# Altium footprint library con-samtec.PCBLIB: 805 footprints (part 23 of 55)
Each footprint in its own frame and in the unit in brackets; x right, y up, seen from the top. Pads: shape width x height; smd on the part's side, far side on the other; paste and mask are expansions set on the pad; w line width, h text height; cw(c..) or ccw(c..) is an arc to the next point about the centre after c.
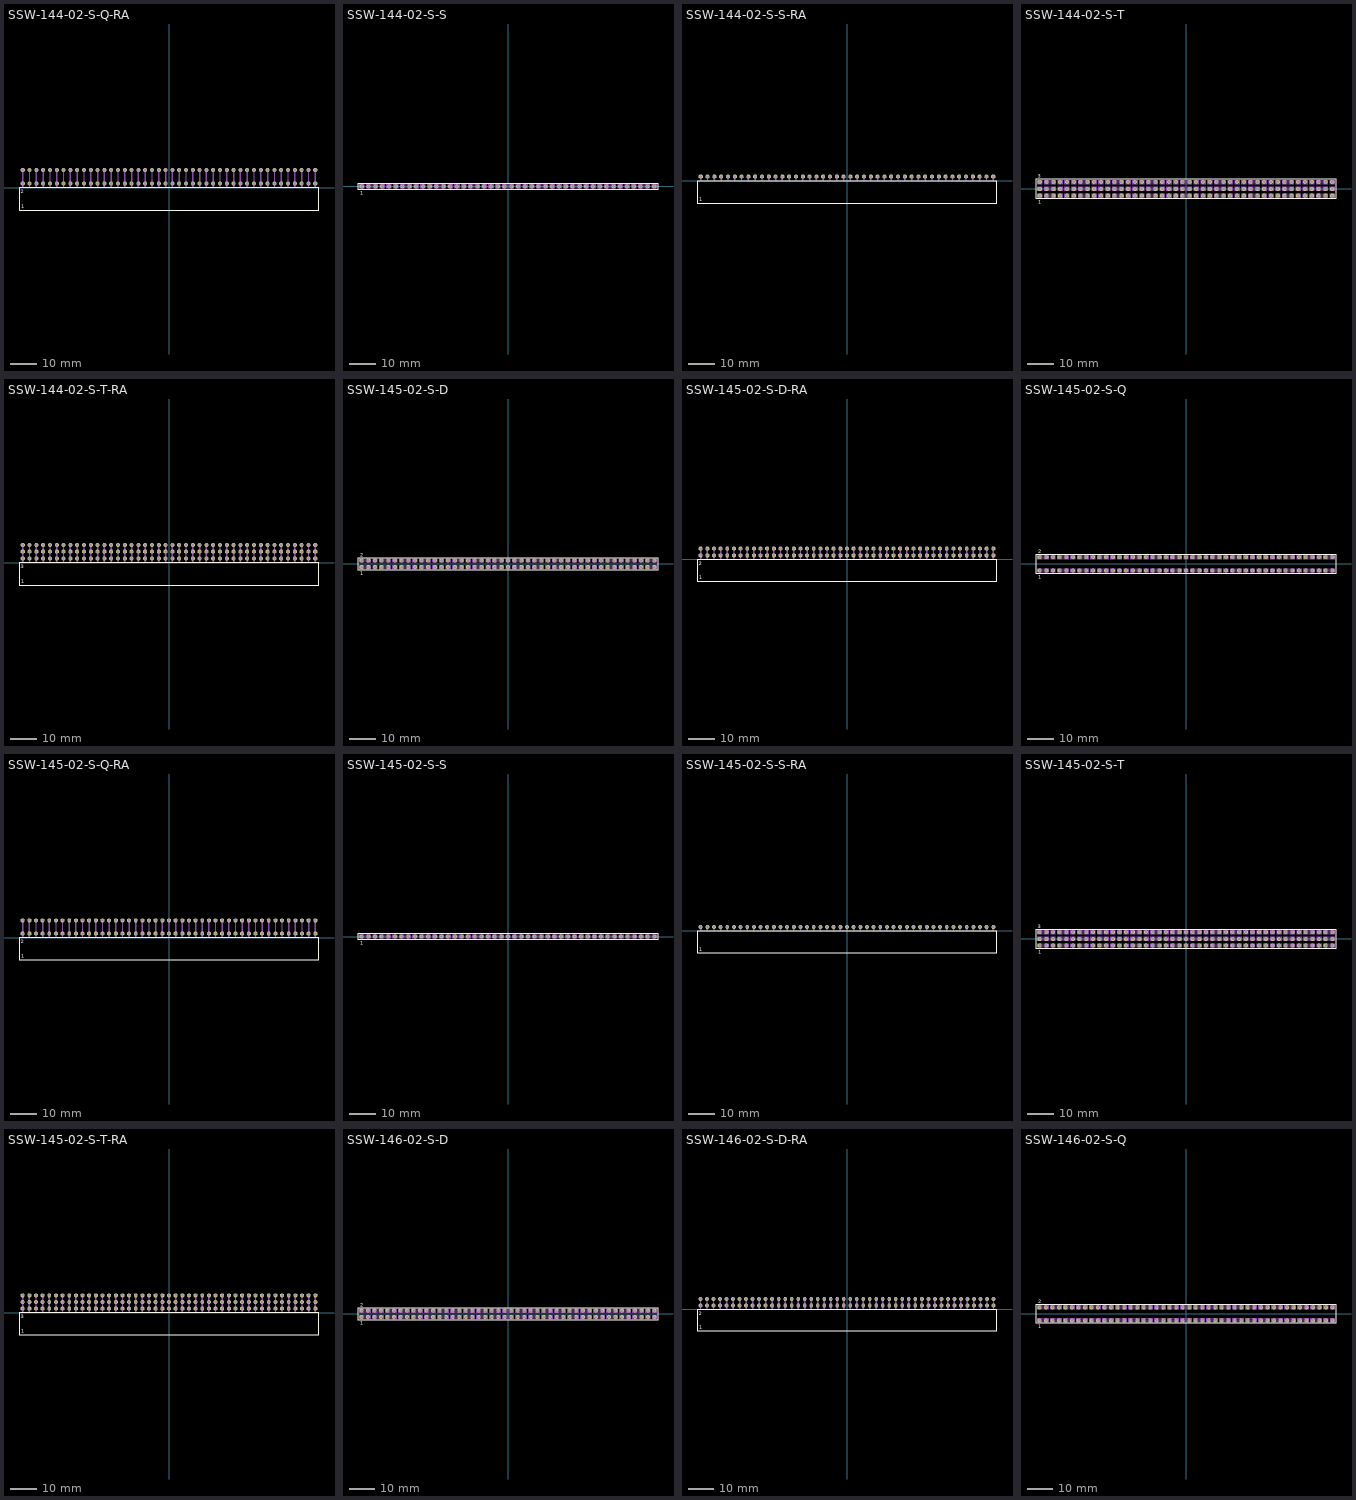
[diagram p22: the footprints below, top view; thin cyan lines are the x and y axes]

## SSW-144-02-S-Q-RA [mil]
pads (88):
  oct 59.06x59.06 hole 39.37: 1(-2150,60) 2(-2150,260) 3(-2050,60) 4(-2050,260) 5(-1950,60) 6(-1950,260) 7(-1850,60) 8(-1850,260) 9(-1750,60) 10(-1750,260) 11(-1650,60) 12(-1650,260) 13(-1550,60) 14(-1550,260) 15(-1450,60) 16(-1450,260) 17(-1350,60) 18(-1350,260) 19(-1250,60) 20(-1250,260) 21(-1150,60) 22(-1150,260) 23(-1050,60) 24(-1050,260) 25(-950,60) 26(-950,260) 27(-850,60) 28(-850,260) 29(-750,60) 30(-750,260) 31(-650,60) 32(-650,260) 33(-550,60) 34(-550,260) 35(-450,60) 36(-450,260) 37(-350,60) 38(-350,260) 39(-250,60) 40(-250,260) 41(-150,60) 42(-150,260) 43(-50,60) 44(-50,260) 45(50,60) 46(50,260) 47(150,60) 48(150,260) 49(250,60) 50(250,260) 51(350,60) 52(350,260) 53(450,60) 54(450,260) 55(550,60) 56(550,260) 57(650,60) 58(650,260) 59(750,60) 60(750,260) 61(850,60) 62(850,260) 63(950,60) 64(950,260) 65(1050,60) 66(1050,260) 67(1150,60) 68(1150,260) 69(1250,60) 70(1250,260) 71(1350,60) 72(1350,260) 73(1450,60) 74(1450,260) 75(1550,60) 76(1550,260) 77(1650,60) 78(1650,260) 79(1750,60) 80(1750,260) 81(1850,60) 82(1850,260) 83(1950,60) 84(1950,260) 85(2050,60) 86(2050,260) 87(2150,60) 88(2150,260)
Top Overlay:
  lines w8: -2205.08,-330.55 2205.08,-330.55 2205.08,-4.17 -2205.08,-4.17 -2205.08,-330.55
  text "1" at -2173.43,-301.18 h56.1
  text "2" at -2176.38,-86.61 h56.1
Mechanical 16:
  rectangle: -2160,0 -2140,270
  rectangle: -2060,0 -2040,270
  rectangle: -1960,0 -1940,270
  rectangle: -1860,0 -1840,270
  rectangle: -1760,0 -1740,270
  rectangle: -1660,0 -1640,270
  rectangle: -1560,0 -1540,270
  rectangle: -1460,0 -1440,270
  rectangle: -1360,0 -1340,270
  rectangle: -1260,0 -1240,270
  rectangle: -1160,0 -1140,270
  rectangle: -1060,0 -1040,270
  rectangle: -960,0 -940,270
  rectangle: -860,0 -840,270
  rectangle: -760,0 -740,270
  rectangle: -660,0 -640,270
  rectangle: -560,0 -540,270
  rectangle: -460,0 -440,270
  rectangle: -360,0 -340,270
  rectangle: -260,0 -240,270
  rectangle: -160,0 -140,270
  rectangle: -60,0 -40,270
  rectangle: 40,0 60,270
  rectangle: 140,0 160,270
  rectangle: 240,0 260,270
  rectangle: 340,0 360,270
  rectangle: 440,0 460,270
  rectangle: 540,0 560,270
  rectangle: 640,0 660,270
  rectangle: 740,0 760,270
  rectangle: 840,0 860,270
  rectangle: 940,0 960,270
  rectangle: 1040,0 1060,270
  rectangle: 1140,0 1160,270
  rectangle: 1240,0 1260,270
  rectangle: 1340,0 1360,270
  rectangle: 1440,0 1460,270
  rectangle: 1540,0 1560,270
  rectangle: 1640,0 1660,270
  rectangle: 1740,0 1760,270
  rectangle: 1840,0 1860,270
  rectangle: 1940,0 1960,270
  rectangle: 2040,0 2060,270
  rectangle: 2140,0 2160,270

## SSW-144-02-S-S [mm]
pads (44):
  oct 1.5x1.5 hole 1: 1(-54.61,0) 2(-52.07,0) 3(-49.53,0) 4(-46.99,0) 5(-44.45,0) 6(-41.91,0) 7(-39.37,0) 8(-36.83,0) 9(-34.29,0) 10(-31.75,0) 11(-29.21,0) 12(-26.67,0) 13(-24.13,0) 14(-21.59,0) 15(-19.05,0) 16(-16.51,0) 17(-13.97,0) 18(-11.43,0) 19(-8.89,0) 20(-6.35,0) 21(-3.81,0) 22(-1.27,0) 23(1.27,0) 24(3.81,0) 25(6.35,0) 26(8.89,0) 27(11.43,0) 28(13.97,0) 29(16.51,0) 30(19.05,0) 31(21.59,0) 32(24.13,0) 33(26.67,0) 34(29.21,0) 35(31.75,0) 36(34.29,0) 37(36.83,0) 38(39.37,0) 39(41.91,0) 40(44.45,0) 41(46.99,0) 42(49.53,0) 43(52.07,0) 44(54.61,0)
Top Overlay:
  lines w0.203: -56.009,-1.155 56.009,-1.155 56.009,1.155 -56.009,1.155 -56.009,-1.155
  text "1" at -55.118,-3.048 h1.42
Mechanical 16:
  drawing of 176 lines, arcs and shapes, not listed

## SSW-144-02-S-S-RA [mil]
pads (44):
  oct 59.06x59.06 hole 39.37: 1(-2150,60) 2(-2050,60) 3(-1950,60) 4(-1850,60) 5(-1750,60) 6(-1650,60) 7(-1550,60) 8(-1450,60) 9(-1350,60) 10(-1250,60) 11(-1150,60) 12(-1050,60) 13(-950,60) 14(-850,60) 15(-750,60) 16(-650,60) 17(-550,60) 18(-450,60) 19(-350,60) 20(-250,60) 21(-150,60) 22(-50,60) 23(50,60) 24(150,60) 25(250,60) 26(350,60) 27(450,60) 28(550,60) 29(650,60) 30(750,60) 31(850,60) 32(950,60) 33(1050,60) 34(1150,60) 35(1250,60) 36(1350,60) 37(1450,60) 38(1550,60) 39(1650,60) 40(1750,60) 41(1850,60) 42(1950,60) 43(2050,60) 44(2150,60)
Top Overlay:
  lines w8: -2205.08,-330.55 2205.08,-330.55 2205.08,-4.17 -2205.08,-4.17 -2205.08,-330.55
  text "1" at -2173.43,-301.18 h56.1
Mechanical 16:
  rectangle: -2160,0 -2140,70
  rectangle: -2060,0 -2040,70
  rectangle: -1960,0 -1940,70
  rectangle: -1860,0 -1840,70
  rectangle: -1760,0 -1740,70
  rectangle: -1660,0 -1640,70
  rectangle: -1560,0 -1540,70
  rectangle: -1460,0 -1440,70
  rectangle: -1360,0 -1340,70
  rectangle: -1260,0 -1240,70
  rectangle: -1160,0 -1140,70
  rectangle: -1060,0 -1040,70
  rectangle: -960,0 -940,70
  rectangle: -860,0 -840,70
  rectangle: -760,0 -740,70
  rectangle: -660,0 -640,70
  rectangle: -560,0 -540,70
  rectangle: -460,0 -440,70
  rectangle: -360,0 -340,70
  rectangle: -260,0 -240,70
  rectangle: -160,0 -140,70
  rectangle: -60,0 -40,70
  rectangle: 40,0 60,70
  rectangle: 140,0 160,70
  rectangle: 240,0 260,70
  rectangle: 340,0 360,70
  rectangle: 440,0 460,70
  rectangle: 540,0 560,70
  rectangle: 640,0 660,70
  rectangle: 740,0 760,70
  rectangle: 840,0 860,70
  rectangle: 940,0 960,70
  rectangle: 1040,0 1060,70
  rectangle: 1140,0 1160,70
  rectangle: 1240,0 1260,70
  rectangle: 1340,0 1360,70
  rectangle: 1440,0 1460,70
  rectangle: 1540,0 1560,70
  rectangle: 1640,0 1660,70
  rectangle: 1740,0 1760,70
  rectangle: 1840,0 1860,70
  rectangle: 1940,0 1960,70
  rectangle: 2040,0 2060,70
  rectangle: 2140,0 2160,70

## SSW-144-02-S-T [mm]
pads (132):
  oct 1.5x1.5 hole 1: 1(-54.61,-2.54) 2(-54.61,0) 3(-54.61,2.54) 4(-52.07,-2.54) 5(-52.07,0) 6(-52.07,2.54) 7(-49.53,-2.54) 8(-49.53,0) 9(-49.53,2.54) 10(-46.99,-2.54) 11(-46.99,0) 12(-46.99,2.54) 13(-44.45,-2.54) 14(-44.45,0) 15(-44.45,2.54) 16(-41.91,-2.54) 17(-41.91,0) 18(-41.91,2.54) 19(-39.37,-2.54) 20(-39.37,0) 21(-39.37,2.54) 22(-36.83,-2.54) 23(-36.83,0) 24(-36.83,2.54) 25(-34.29,-2.54) 26(-34.29,0) 27(-34.29,2.54) 28(-31.75,-2.54) 29(-31.75,0) 30(-31.75,2.54) 31(-29.21,-2.54) 32(-29.21,0) 33(-29.21,2.54) 34(-26.67,-2.54) 35(-26.67,0) 36(-26.67,2.54) 37(-24.13,-2.54) 38(-24.13,0) 39(-24.13,2.54) 40(-21.59,-2.54) 41(-21.59,0) 42(-21.59,2.54) 43(-19.05,-2.54) 44(-19.05,0) 45(-19.05,2.54) 46(-16.51,-2.54) 47(-16.51,0) 48(-16.51,2.54) 49(-13.97,-2.54) 50(-13.97,0) 51(-13.97,2.54) 52(-11.43,-2.54) 53(-11.43,0) 54(-11.43,2.54) 55(-8.89,-2.54) 56(-8.89,0) 57(-8.89,2.54) 58(-6.35,-2.54) 59(-6.35,0) 60(-6.35,2.54) 61(-3.81,-2.54) 62(-3.81,0) 63(-3.81,2.54) 64(-1.27,-2.54) 65(-1.27,0) 66(-1.27,2.54) 67(1.27,-2.54) 68(1.27,0) 69(1.27,2.54) 70(3.81,-2.54) 71(3.81,0) 72(3.81,2.54) 73(6.35,-2.54) 74(6.35,0) 75(6.35,2.54) 76(8.89,-2.54) 77(8.89,0) 78(8.89,2.54) 79(11.43,-2.54) 80(11.43,0) 81(11.43,2.54) 82(13.97,-2.54) 83(13.97,0) 84(13.97,2.54) 85(16.51,-2.54) 86(16.51,0) 87(16.51,2.54) 88(19.05,-2.54) 89(19.05,0) 90(19.05,2.54) 91(21.59,-2.54) 92(21.59,0) 93(21.59,2.54) 94(24.13,-2.54) 95(24.13,0) 96(24.13,2.54) 97(26.67,-2.54) 98(26.67,0) 99(26.67,2.54) 100(29.21,-2.54) 101(29.21,0) 102(29.21,2.54) 103(31.75,-2.54) 104(31.75,0) 105(31.75,2.54) 106(34.29,-2.54) 107(34.29,0) 108(34.29,2.54) 109(36.83,-2.54) 110(36.83,0) 111(36.83,2.54) 112(39.37,-2.54) 113(39.37,0) 114(39.37,2.54) 115(41.91,-2.54) 116(41.91,0) 117(41.91,2.54) 118(44.45,-2.54) 119(44.45,0) 120(44.45,2.54) 121(46.99,-2.54) 122(46.99,0) 123(46.99,2.54) 124(49.53,-2.54) 125(49.53,0) 126(49.53,2.54) 127(52.07,-2.54) 128(52.07,0) 129(52.07,2.54) 130(54.61,-2.54) 131(54.61,0) 132(54.61,2.54)
Top Overlay:
  lines w0.203: -56.009,-3.695 56.009,-3.695 56.009,3.695 -56.009,3.695 -56.009,-3.695
  text "1" at -55.118,-5.588 h1.42
  text "3" at -55.372,4.064 h1.42
Mechanical 16:
  drawing of 528 lines, arcs and shapes, not listed

## SSW-144-02-S-T-RA [mil]
pads (132):
  oct 59.06x59.06 hole 39.37: 1(-2150,60) 2(-2150,160) 3(-2150,260) 4(-2050,60) 5(-2050,160) 6(-2050,260) 7(-1950,60) 8(-1950,160) 9(-1950,260) 10(-1850,60) 11(-1850,160) 12(-1850,260) 13(-1750,60) 14(-1750,160) 15(-1750,260) 16(-1650,60) 17(-1650,160) 18(-1650,260) 19(-1550,60) 20(-1550,160) 21(-1550,260) 22(-1450,60) 23(-1450,160) 24(-1450,260) 25(-1350,60) 26(-1350,160) 27(-1350,260) 28(-1250,60) 29(-1250,160) 30(-1250,260) 31(-1150,60) 32(-1150,160) 33(-1150,260) 34(-1050,60) 35(-1050,160) 36(-1050,260) 37(-950,60) 38(-950,160) 39(-950,260) 40(-850,60) 41(-850,160) 42(-850,260) 43(-750,60) 44(-750,160) 45(-750,260) 46(-650,60) 47(-650,160) 48(-650,260) 49(-550,60) 50(-550,160) 51(-550,260) 52(-450,60) 53(-450,160) 54(-450,260) 55(-350,60) 56(-350,160) 57(-350,260) 58(-250,60) 59(-250,160) 60(-250,260) 61(-150,60) 62(-150,160) 63(-150,260) 64(-50,60) 65(-50,160) 66(-50,260) 67(50,60) 68(50,160) 69(50,260) 70(150,60) 71(150,160) 72(150,260) 73(250,60) 74(250,160) 75(250,260) 76(350,60) 77(350,160) 78(350,260) 79(450,60) 80(450,160) 81(450,260) 82(550,60) 83(550,160) 84(550,260) 85(650,60) 86(650,160) 87(650,260) 88(750,60) 89(750,160) 90(750,260) 91(850,60) 92(850,160) 93(850,260) 94(950,60) 95(950,160) 96(950,260) 97(1050,60) 98(1050,160) 99(1050,260) 100(1150,60) 101(1150,160) 102(1150,260) 103(1250,60) 104(1250,160) 105(1250,260) 106(1350,60) 107(1350,160) 108(1350,260) 109(1450,60) 110(1450,160) 111(1450,260) 112(1550,60) 113(1550,160) 114(1550,260) 115(1650,60) 116(1650,160) 117(1650,260) 118(1750,60) 119(1750,160) 120(1750,260) 121(1850,60) 122(1850,160) 123(1850,260) 124(1950,60) 125(1950,160) 126(1950,260) 127(2050,60) 128(2050,160) 129(2050,260) 130(2150,60) 131(2150,160) 132(2150,260)
Top Overlay:
  lines w8: -2205.08,-330.55 2205.08,-330.55 2205.08,-4.17 -2205.08,-4.17 -2205.08,-330.55
  text "1" at -2173.43,-301.18 h56.1
  text "3" at -2176.38,-86.61 h56.1
Mechanical 16:
  rectangle: -2160,0 -2140,270
  rectangle: -2060,0 -2040,270
  rectangle: -1960,0 -1940,270
  rectangle: -1860,0 -1840,270
  rectangle: -1760,0 -1740,270
  rectangle: -1660,0 -1640,270
  rectangle: -1560,0 -1540,270
  rectangle: -1460,0 -1440,270
  rectangle: -1360,0 -1340,270
  rectangle: -1260,0 -1240,270
  rectangle: -1160,0 -1140,270
  rectangle: -1060,0 -1040,270
  rectangle: -960,0 -940,270
  rectangle: -860,0 -840,270
  rectangle: -760,0 -740,270
  rectangle: -660,0 -640,270
  rectangle: -560,0 -540,270
  rectangle: -460,0 -440,270
  rectangle: -360,0 -340,270
  rectangle: -260,0 -240,270
  rectangle: -160,0 -140,270
  rectangle: -60,0 -40,270
  rectangle: 40,0 60,270
  rectangle: 140,0 160,270
  rectangle: 240,0 260,270
  rectangle: 340,0 360,270
  rectangle: 440,0 460,270
  rectangle: 540,0 560,270
  rectangle: 640,0 660,270
  rectangle: 740,0 760,270
  rectangle: 840,0 860,270
  rectangle: 940,0 960,270
  rectangle: 1040,0 1060,270
  rectangle: 1140,0 1160,270
  rectangle: 1240,0 1260,270
  rectangle: 1340,0 1360,270
  rectangle: 1440,0 1460,270
  rectangle: 1540,0 1560,270
  rectangle: 1640,0 1660,270
  rectangle: 1740,0 1760,270
  rectangle: 1840,0 1860,270
  rectangle: 1940,0 1960,270
  rectangle: 2040,0 2060,270
  rectangle: 2140,0 2160,270

## SSW-145-02-S-D [mm]
pads (90):
  oct 1.5x1.5 hole 1: 1(-55.88,-1.27) 2(-55.88,1.27) 3(-53.34,-1.27) 4(-53.34,1.27) 5(-50.8,-1.27) 6(-50.8,1.27) 7(-48.26,-1.27) 8(-48.26,1.27) 9(-45.72,-1.27) 10(-45.72,1.27) 11(-43.18,-1.27) 12(-43.18,1.27) 13(-40.64,-1.27) 14(-40.64,1.27) 15(-38.1,-1.27) 16(-38.1,1.27) 17(-35.56,-1.27) 18(-35.56,1.27) 19(-33.02,-1.27) 20(-33.02,1.27) 21(-30.48,-1.27) 22(-30.48,1.27) 23(-27.94,-1.27) 24(-27.94,1.27) 25(-25.4,-1.27) 26(-25.4,1.27) 27(-22.86,-1.27) 28(-22.86,1.27) 29(-20.32,-1.27) 30(-20.32,1.27) 31(-17.78,-1.27) 32(-17.78,1.27) 33(-15.24,-1.27) 34(-15.24,1.27) 35(-12.7,-1.27) 36(-12.7,1.27) 37(-10.16,-1.27) 38(-10.16,1.27) 39(-7.62,-1.27) 40(-7.62,1.27) 41(-5.08,-1.27) 42(-5.08,1.27) 43(-2.54,-1.27) 44(-2.54,1.27) 45(0,-1.27) 46(0,1.27) 47(2.54,-1.27) 48(2.54,1.27) 49(5.08,-1.27) 50(5.08,1.27) 51(7.62,-1.27) 52(7.62,1.27) 53(10.16,-1.27) 54(10.16,1.27) 55(12.7,-1.27) 56(12.7,1.27) 57(15.24,-1.27) 58(15.24,1.27) 59(17.78,-1.27) 60(17.78,1.27) 61(20.32,-1.27) 62(20.32,1.27) 63(22.86,-1.27) 64(22.86,1.27) 65(25.4,-1.27) 66(25.4,1.27) 67(27.94,-1.27) 68(27.94,1.27) 69(30.48,-1.27) 70(30.48,1.27) 71(33.02,-1.27) 72(33.02,1.27) 73(35.56,-1.27) 74(35.56,1.27) 75(38.1,-1.27) 76(38.1,1.27) 77(40.64,-1.27) 78(40.64,1.27) 79(43.18,-1.27) 80(43.18,1.27) 81(45.72,-1.27) 82(45.72,1.27) 83(48.26,-1.27) 84(48.26,1.27) 85(50.8,-1.27) 86(50.8,1.27) 87(53.34,-1.27) 88(53.34,1.27) 89(55.88,-1.27) 90(55.88,1.27)
Top Overlay:
  lines w0.203: -57.279,-2.425 57.279,-2.425 57.279,2.425 -57.279,2.425 -57.279,-2.425
  text "1" at -56.388,-4.318 h1.42
  text "2" at -56.388,2.794 h1.42
Mechanical 16:
  drawing of 360 lines, arcs and shapes, not listed

## SSW-145-02-S-D-RA [mil]
pads (90):
  oct 59.06x59.06 hole 39.37: 1(-2200,60) 2(-2200,160) 3(-2100,60) 4(-2100,160) 5(-2000,60) 6(-2000,160) 7(-1900,60) 8(-1900,160) 9(-1800,60) 10(-1800,160) 11(-1700,60) 12(-1700,160) 13(-1600,60) 14(-1600,160) 15(-1500,60) 16(-1500,160) 17(-1400,60) 18(-1400,160) 19(-1300,60) 20(-1300,160) 21(-1200,60) 22(-1200,160) 23(-1100,60) 24(-1100,160) 25(-1000,60) 26(-1000,160) 27(-900,60) 28(-900,160) 29(-800,60) 30(-800,160) 31(-700,60) 32(-700,160) 33(-600,60) 34(-600,160) 35(-500,60) 36(-500,160) 37(-400,60) 38(-400,160) 39(-300,60) 40(-300,160) 41(-200,60) 42(-200,160) 43(-100,60) 44(-100,160) 45(0,60) 46(0,160) 47(100,60) 48(100,160) 49(200,60) 50(200,160) 51(300,60) 52(300,160) 53(400,60) 54(400,160) 55(500,60) 56(500,160) 57(600,60) 58(600,160) 59(700,60) 60(700,160) 61(800,60) 62(800,160) 63(900,60) 64(900,160) 65(1000,60) 66(1000,160) 67(1100,60) 68(1100,160) 69(1200,60) 70(1200,160) 71(1300,60) 72(1300,160) 73(1400,60) 74(1400,160) 75(1500,60) 76(1500,160) 77(1600,60) 78(1600,160) 79(1700,60) 80(1700,160) 81(1800,60) 82(1800,160) 83(1900,60) 84(1900,160) 85(2000,60) 86(2000,160) 87(2100,60) 88(2100,160) 89(2200,60) 90(2200,160)
Top Overlay:
  lines w8: -2255.08,-330.55 2255.08,-330.55 2255.08,-4.17 -2255.08,-4.17 -2255.08,-330.55
  text "1" at -2223.43,-301.18 h56.1
  text "2" at -2226.38,-86.61 h56.1
Mechanical 16:
  rectangle: -2210,0 -2190,170
  rectangle: -2110,0 -2090,170
  rectangle: -2010,0 -1990,170
  rectangle: -1910,0 -1890,170
  rectangle: -1810,0 -1790,170
  rectangle: -1710,0 -1690,170
  rectangle: -1610,0 -1590,170
  rectangle: -1510,0 -1490,170
  rectangle: -1410,0 -1390,170
  rectangle: -1310,0 -1290,170
  rectangle: -1210,0 -1190,170
  rectangle: -1110,0 -1090,170
  rectangle: -1010,0 -990,170
  rectangle: -910,0 -890,170
  rectangle: -810,0 -790,170
  rectangle: -710,0 -690,170
  rectangle: -610,0 -590,170
  rectangle: -510,0 -490,170
  rectangle: -410,0 -390,170
  rectangle: -310,0 -290,170
  rectangle: -210,0 -190,170
  rectangle: -110,0 -90,170
  rectangle: -10,0 10,170
  rectangle: 90,0 110,170
  rectangle: 190,0 210,170
  rectangle: 290,0 310,170
  rectangle: 390,0 410,170
  rectangle: 490,0 510,170
  rectangle: 590,0 610,170
  rectangle: 690,0 710,170
  rectangle: 790,0 810,170
  rectangle: 890,0 910,170
  rectangle: 990,0 1010,170
  rectangle: 1090,0 1110,170
  rectangle: 1190,0 1210,170
  rectangle: 1290,0 1310,170
  rectangle: 1390,0 1410,170
  rectangle: 1490,0 1510,170
  rectangle: 1590,0 1610,170
  rectangle: 1690,0 1710,170
  rectangle: 1790,0 1810,170
  rectangle: 1890,0 1910,170
  rectangle: 1990,0 2010,170
  rectangle: 2090,0 2110,170
  rectangle: 2190,0 2210,170

## SSW-145-02-S-Q [mm]
pads (90):
  oct 1.5x1.5 hole 1: 1(-55.88,-2.54) 2(-55.88,2.54) 3(-53.34,-2.54) 4(-53.34,2.54) 5(-50.8,-2.54) 6(-50.8,2.54) 7(-48.26,-2.54) 8(-48.26,2.54) 9(-45.72,-2.54) 10(-45.72,2.54) 11(-43.18,-2.54) 12(-43.18,2.54) 13(-40.64,-2.54) 14(-40.64,2.54) 15(-38.1,-2.54) 16(-38.1,2.54) 17(-35.56,-2.54) 18(-35.56,2.54) 19(-33.02,-2.54) 20(-33.02,2.54) 21(-30.48,-2.54) 22(-30.48,2.54) 23(-27.94,-2.54) 24(-27.94,2.54) 25(-25.4,-2.54) 26(-25.4,2.54) 27(-22.86,-2.54) 28(-22.86,2.54) 29(-20.32,-2.54) 30(-20.32,2.54) 31(-17.78,-2.54) 32(-17.78,2.54) 33(-15.24,-2.54) 34(-15.24,2.54) 35(-12.7,-2.54) 36(-12.7,2.54) 37(-10.16,-2.54) 38(-10.16,2.54) 39(-7.62,-2.54) 40(-7.62,2.54) 41(-5.08,-2.54) 42(-5.08,2.54) 43(-2.54,-2.54) 44(-2.54,2.54) 45(0,-2.54) 46(0,2.54) 47(2.54,-2.54) 48(2.54,2.54) 49(5.08,-2.54) 50(5.08,2.54) 51(7.62,-2.54) 52(7.62,2.54) 53(10.16,-2.54) 54(10.16,2.54) 55(12.7,-2.54) 56(12.7,2.54) 57(15.24,-2.54) 58(15.24,2.54) 59(17.78,-2.54) 60(17.78,2.54) 61(20.32,-2.54) 62(20.32,2.54) 63(22.86,-2.54) 64(22.86,2.54) 65(25.4,-2.54) 66(25.4,2.54) 67(27.94,-2.54) 68(27.94,2.54) 69(30.48,-2.54) 70(30.48,2.54) 71(33.02,-2.54) 72(33.02,2.54) 73(35.56,-2.54) 74(35.56,2.54) 75(38.1,-2.54) 76(38.1,2.54) 77(40.64,-2.54) 78(40.64,2.54) 79(43.18,-2.54) 80(43.18,2.54) 81(45.72,-2.54) 82(45.72,2.54) 83(48.26,-2.54) 84(48.26,2.54) 85(50.8,-2.54) 86(50.8,2.54) 87(53.34,-2.54) 88(53.34,2.54) 89(55.88,-2.54) 90(55.88,2.54)
Top Overlay:
  lines w0.203: -57.279,-3.695 57.279,-3.695 57.279,3.695 -57.279,3.695 -57.279,-3.695
  text "1" at -56.388,-5.588 h1.42
  text "2" at -56.388,4.064 h1.42
Mechanical 16:
  drawing of 360 lines, arcs and shapes, not listed

## SSW-145-02-S-Q-RA [mil]
pads (90):
  oct 59.06x59.06 hole 39.37: 1(-2200,60) 2(-2200,260) 3(-2100,60) 4(-2100,260) 5(-2000,60) 6(-2000,260) 7(-1900,60) 8(-1900,260) 9(-1800,60) 10(-1800,260) 11(-1700,60) 12(-1700,260) 13(-1600,60) 14(-1600,260) 15(-1500,60) 16(-1500,260) 17(-1400,60) 18(-1400,260) 19(-1300,60) 20(-1300,260) 21(-1200,60) 22(-1200,260) 23(-1100,60) 24(-1100,260) 25(-1000,60) 26(-1000,260) 27(-900,60) 28(-900,260) 29(-800,60) 30(-800,260) 31(-700,60) 32(-700,260) 33(-600,60) 34(-600,260) 35(-500,60) 36(-500,260) 37(-400,60) 38(-400,260) 39(-300,60) 40(-300,260) 41(-200,60) 42(-200,260) 43(-100,60) 44(-100,260) 45(0,60) 46(0,260) 47(100,60) 48(100,260) 49(200,60) 50(200,260) 51(300,60) 52(300,260) 53(400,60) 54(400,260) 55(500,60) 56(500,260) 57(600,60) 58(600,260) 59(700,60) 60(700,260) 61(800,60) 62(800,260) 63(900,60) 64(900,260) 65(1000,60) 66(1000,260) 67(1100,60) 68(1100,260) 69(1200,60) 70(1200,260) 71(1300,60) 72(1300,260) 73(1400,60) 74(1400,260) 75(1500,60) 76(1500,260) 77(1600,60) 78(1600,260) 79(1700,60) 80(1700,260) 81(1800,60) 82(1800,260) 83(1900,60) 84(1900,260) 85(2000,60) 86(2000,260) 87(2100,60) 88(2100,260) 89(2200,60) 90(2200,260)
Top Overlay:
  lines w8: -2255.08,-330.55 2255.08,-330.55 2255.08,-4.17 -2255.08,-4.17 -2255.08,-330.55
  text "1" at -2223.43,-301.18 h56.1
  text "2" at -2226.38,-86.61 h56.1
Mechanical 16:
  rectangle: -2210,0 -2190,270
  rectangle: -2110,0 -2090,270
  rectangle: -2010,0 -1990,270
  rectangle: -1910,0 -1890,270
  rectangle: -1810,0 -1790,270
  rectangle: -1710,0 -1690,270
  rectangle: -1610,0 -1590,270
  rectangle: -1510,0 -1490,270
  rectangle: -1410,0 -1390,270
  rectangle: -1310,0 -1290,270
  rectangle: -1210,0 -1190,270
  rectangle: -1110,0 -1090,270
  rectangle: -1010,0 -990,270
  rectangle: -910,0 -890,270
  rectangle: -810,0 -790,270
  rectangle: -710,0 -690,270
  rectangle: -610,0 -590,270
  rectangle: -510,0 -490,270
  rectangle: -410,0 -390,270
  rectangle: -310,0 -290,270
  rectangle: -210,0 -190,270
  rectangle: -110,0 -90,270
  rectangle: -10,0 10,270
  rectangle: 90,0 110,270
  rectangle: 190,0 210,270
  rectangle: 290,0 310,270
  rectangle: 390,0 410,270
  rectangle: 490,0 510,270
  rectangle: 590,0 610,270
  rectangle: 690,0 710,270
  rectangle: 790,0 810,270
  rectangle: 890,0 910,270
  rectangle: 990,0 1010,270
  rectangle: 1090,0 1110,270
  rectangle: 1190,0 1210,270
  rectangle: 1290,0 1310,270
  rectangle: 1390,0 1410,270
  rectangle: 1490,0 1510,270
  rectangle: 1590,0 1610,270
  rectangle: 1690,0 1710,270
  rectangle: 1790,0 1810,270
  rectangle: 1890,0 1910,270
  rectangle: 1990,0 2010,270
  rectangle: 2090,0 2110,270
  rectangle: 2190,0 2210,270

## SSW-145-02-S-S [mm]
pads (45):
  oct 1.5x1.5 hole 1: 1(-55.88,0) 2(-53.34,0) 3(-50.8,0) 4(-48.26,0) 5(-45.72,0) 6(-43.18,0) 7(-40.64,0) 8(-38.1,0) 9(-35.56,0) 10(-33.02,0) 11(-30.48,0) 12(-27.94,0) 13(-25.4,0) 14(-22.86,0) 15(-20.32,0) 16(-17.78,0) 17(-15.24,0) 18(-12.7,0) 19(-10.16,0) 20(-7.62,0) 21(-5.08,0) 22(-2.54,0) 23(0,0) 24(2.54,0) 25(5.08,0) 26(7.62,0) 27(10.16,0) 28(12.7,0) 29(15.24,0) 30(17.78,0) 31(20.32,0) 32(22.86,0) 33(25.4,0) 34(27.94,0) 35(30.48,0) 36(33.02,0) 37(35.56,0) 38(38.1,0) 39(40.64,0) 40(43.18,0) 41(45.72,0) 42(48.26,0) 43(50.8,0) 44(53.34,0) 45(55.88,0)
Top Overlay:
  lines w0.203: -57.279,-1.155 57.279,-1.155 57.279,1.155 -57.279,1.155 -57.279,-1.155
  text "1" at -56.388,-3.048 h1.42
Mechanical 16:
  drawing of 180 lines, arcs and shapes, not listed

## SSW-145-02-S-S-RA [mil]
pads (45):
  oct 59.06x59.06 hole 39.37: 1(-2200,60) 2(-2100,60) 3(-2000,60) 4(-1900,60) 5(-1800,60) 6(-1700,60) 7(-1600,60) 8(-1500,60) 9(-1400,60) 10(-1300,60) 11(-1200,60) 12(-1100,60) 13(-1000,60) 14(-900,60) 15(-800,60) 16(-700,60) 17(-600,60) 18(-500,60) 19(-400,60) 20(-300,60) 21(-200,60) 22(-100,60) 23(0,60) 24(100,60) 25(200,60) 26(300,60) 27(400,60) 28(500,60) 29(600,60) 30(700,60) 31(800,60) 32(900,60) 33(1000,60) 34(1100,60) 35(1200,60) 36(1300,60) 37(1400,60) 38(1500,60) 39(1600,60) 40(1700,60) 41(1800,60) 42(1900,60) 43(2000,60) 44(2100,60) 45(2200,60)
Top Overlay:
  lines w8: -2255.08,-330.55 2255.08,-330.55 2255.08,-4.17 -2255.08,-4.17 -2255.08,-330.55
  text "1" at -2223.43,-301.18 h56.1
Mechanical 16:
  rectangle: -2210,0 -2190,70
  rectangle: -2110,0 -2090,70
  rectangle: -2010,0 -1990,70
  rectangle: -1910,0 -1890,70
  rectangle: -1810,0 -1790,70
  rectangle: -1710,0 -1690,70
  rectangle: -1610,0 -1590,70
  rectangle: -1510,0 -1490,70
  rectangle: -1410,0 -1390,70
  rectangle: -1310,0 -1290,70
  rectangle: -1210,0 -1190,70
  rectangle: -1110,0 -1090,70
  rectangle: -1010,0 -990,70
  rectangle: -910,0 -890,70
  rectangle: -810,0 -790,70
  rectangle: -710,0 -690,70
  rectangle: -610,0 -590,70
  rectangle: -510,0 -490,70
  rectangle: -410,0 -390,70
  rectangle: -310,0 -290,70
  rectangle: -210,0 -190,70
  rectangle: -110,0 -90,70
  rectangle: -10,0 10,70
  rectangle: 90,0 110,70
  rectangle: 190,0 210,70
  rectangle: 290,0 310,70
  rectangle: 390,0 410,70
  rectangle: 490,0 510,70
  rectangle: 590,0 610,70
  rectangle: 690,0 710,70
  rectangle: 790,0 810,70
  rectangle: 890,0 910,70
  rectangle: 990,0 1010,70
  rectangle: 1090,0 1110,70
  rectangle: 1190,0 1210,70
  rectangle: 1290,0 1310,70
  rectangle: 1390,0 1410,70
  rectangle: 1490,0 1510,70
  rectangle: 1590,0 1610,70
  rectangle: 1690,0 1710,70
  rectangle: 1790,0 1810,70
  rectangle: 1890,0 1910,70
  rectangle: 1990,0 2010,70
  rectangle: 2090,0 2110,70
  rectangle: 2190,0 2210,70

## SSW-145-02-S-T [mm]
pads (135):
  oct 1.5x1.5 hole 1: 1(-55.88,-2.54) 2(-55.88,0) 3(-55.88,2.54) 4(-53.34,-2.54) 5(-53.34,0) 6(-53.34,2.54) 7(-50.8,-2.54) 8(-50.8,0) 9(-50.8,2.54) 10(-48.26,-2.54) 11(-48.26,0) 12(-48.26,2.54) 13(-45.72,-2.54) 14(-45.72,0) 15(-45.72,2.54) 16(-43.18,-2.54) 17(-43.18,0) 18(-43.18,2.54) 19(-40.64,-2.54) 20(-40.64,0) 21(-40.64,2.54) 22(-38.1,-2.54) 23(-38.1,0) 24(-38.1,2.54) 25(-35.56,-2.54) 26(-35.56,0) 27(-35.56,2.54) 28(-33.02,-2.54) 29(-33.02,0) 30(-33.02,2.54) 31(-30.48,-2.54) 32(-30.48,0) 33(-30.48,2.54) 34(-27.94,-2.54) 35(-27.94,0) 36(-27.94,2.54) 37(-25.4,-2.54) 38(-25.4,0) 39(-25.4,2.54) 40(-22.86,-2.54) 41(-22.86,0) 42(-22.86,2.54) 43(-20.32,-2.54) 44(-20.32,0) 45(-20.32,2.54) 46(-17.78,-2.54) 47(-17.78,0) 48(-17.78,2.54) 49(-15.24,-2.54) 50(-15.24,0) 51(-15.24,2.54) 52(-12.7,-2.54) 53(-12.7,0) 54(-12.7,2.54) 55(-10.16,-2.54) 56(-10.16,0) 57(-10.16,2.54) 58(-7.62,-2.54) 59(-7.62,0) 60(-7.62,2.54) 61(-5.08,-2.54) 62(-5.08,0) 63(-5.08,2.54) 64(-2.54,-2.54) 65(-2.54,0) 66(-2.54,2.54) 67(0,-2.54) 68(0,0) 69(0,2.54) 70(2.54,-2.54) 71(2.54,0) 72(2.54,2.54) 73(5.08,-2.54) 74(5.08,0) 75(5.08,2.54) 76(7.62,-2.54) 77(7.62,0) 78(7.62,2.54) 79(10.16,-2.54) 80(10.16,0) 81(10.16,2.54) 82(12.7,-2.54) 83(12.7,0) 84(12.7,2.54) 85(15.24,-2.54) 86(15.24,0) 87(15.24,2.54) 88(17.78,-2.54) 89(17.78,0) 90(17.78,2.54) 91(20.32,-2.54) 92(20.32,0) 93(20.32,2.54) 94(22.86,-2.54) 95(22.86,0) 96(22.86,2.54) 97(25.4,-2.54) 98(25.4,0) 99(25.4,2.54) 100(27.94,-2.54) 101(27.94,0) 102(27.94,2.54) 103(30.48,-2.54) 104(30.48,0) 105(30.48,2.54) 106(33.02,-2.54) 107(33.02,0) 108(33.02,2.54) 109(35.56,-2.54) 110(35.56,0) 111(35.56,2.54) 112(38.1,-2.54) 113(38.1,0) 114(38.1,2.54) 115(40.64,-2.54) 116(40.64,0) 117(40.64,2.54) 118(43.18,-2.54) 119(43.18,0) 120(43.18,2.54) 121(45.72,-2.54) 122(45.72,0) 123(45.72,2.54) 124(48.26,-2.54) 125(48.26,0) 126(48.26,2.54) 127(50.8,-2.54) 128(50.8,0) 129(50.8,2.54) 130(53.34,-2.54) 131(53.34,0) 132(53.34,2.54) 133(55.88,-2.54) 134(55.88,0) 135(55.88,2.54)
Top Overlay:
  lines w0.203: -57.279,-3.695 57.279,-3.695 57.279,3.695 -57.279,3.695 -57.279,-3.695
  text "1" at -56.388,-5.588 h1.42
  text "3" at -56.642,4.064 h1.42
Mechanical 16:
  drawing of 540 lines, arcs and shapes, not listed

## SSW-145-02-S-T-RA [mil]
pads (135):
  oct 59.06x59.06 hole 39.37: 1(-2200,60) 2(-2200,160) 3(-2200,260) 4(-2100,60) 5(-2100,160) 6(-2100,260) 7(-2000,60) 8(-2000,160) 9(-2000,260) 10(-1900,60) 11(-1900,160) 12(-1900,260) 13(-1800,60) 14(-1800,160) 15(-1800,260) 16(-1700,60) 17(-1700,160) 18(-1700,260) 19(-1600,60) 20(-1600,160) 21(-1600,260) 22(-1500,60) 23(-1500,160) 24(-1500,260) 25(-1400,60) 26(-1400,160) 27(-1400,260) 28(-1300,60) 29(-1300,160) 30(-1300,260) 31(-1200,60) 32(-1200,160) 33(-1200,260) 34(-1100,60) 35(-1100,160) 36(-1100,260) 37(-1000,60) 38(-1000,160) 39(-1000,260) 40(-900,60) 41(-900,160) 42(-900,260) 43(-800,60) 44(-800,160) 45(-800,260) 46(-700,60) 47(-700,160) 48(-700,260) 49(-600,60) 50(-600,160) 51(-600,260) 52(-500,60) 53(-500,160) 54(-500,260) 55(-400,60) 56(-400,160) 57(-400,260) 58(-300,60) 59(-300,160) 60(-300,260) 61(-200,60) 62(-200,160) 63(-200,260) 64(-100,60) 65(-100,160) 66(-100,260) 67(0,60) 68(0,160) 69(0,260) 70(100,60) 71(100,160) 72(100,260) 73(200,60) 74(200,160) 75(200,260) 76(300,60) 77(300,160) 78(300,260) 79(400,60) 80(400,160) 81(400,260) 82(500,60) 83(500,160) 84(500,260) 85(600,60) 86(600,160) 87(600,260) 88(700,60) 89(700,160) 90(700,260) 91(800,60) 92(800,160) 93(800,260) 94(900,60) 95(900,160) 96(900,260) 97(1000,60) 98(1000,160) 99(1000,260) 100(1100,60) 101(1100,160) 102(1100,260) 103(1200,60) 104(1200,160) 105(1200,260) 106(1300,60) 107(1300,160) 108(1300,260) 109(1400,60) 110(1400,160) 111(1400,260) 112(1500,60) 113(1500,160) 114(1500,260) 115(1600,60) 116(1600,160) 117(1600,260) 118(1700,60) 119(1700,160) 120(1700,260) 121(1800,60) 122(1800,160) 123(1800,260) 124(1900,60) 125(1900,160) 126(1900,260) 127(2000,60) 128(2000,160) 129(2000,260) 130(2100,60) 131(2100,160) 132(2100,260) 133(2200,60) 134(2200,160) 135(2200,260)
Top Overlay:
  lines w8: -2255.08,-330.55 2255.08,-330.55 2255.08,-4.17 -2255.08,-4.17 -2255.08,-330.55
  text "1" at -2223.43,-301.18 h56.1
  text "3" at -2226.38,-86.61 h56.1
Mechanical 16:
  rectangle: -2210,0 -2190,270
  rectangle: -2110,0 -2090,270
  rectangle: -2010,0 -1990,270
  rectangle: -1910,0 -1890,270
  rectangle: -1810,0 -1790,270
  rectangle: -1710,0 -1690,270
  rectangle: -1610,0 -1590,270
  rectangle: -1510,0 -1490,270
  rectangle: -1410,0 -1390,270
  rectangle: -1310,0 -1290,270
  rectangle: -1210,0 -1190,270
  rectangle: -1110,0 -1090,270
  rectangle: -1010,0 -990,270
  rectangle: -910,0 -890,270
  rectangle: -810,0 -790,270
  rectangle: -710,0 -690,270
  rectangle: -610,0 -590,270
  rectangle: -510,0 -490,270
  rectangle: -410,0 -390,270
  rectangle: -310,0 -290,270
  rectangle: -210,0 -190,270
  rectangle: -110,0 -90,270
  rectangle: -10,0 10,270
  rectangle: 90,0 110,270
  rectangle: 190,0 210,270
  rectangle: 290,0 310,270
  rectangle: 390,0 410,270
  rectangle: 490,0 510,270
  rectangle: 590,0 610,270
  rectangle: 690,0 710,270
  rectangle: 790,0 810,270
  rectangle: 890,0 910,270
  rectangle: 990,0 1010,270
  rectangle: 1090,0 1110,270
  rectangle: 1190,0 1210,270
  rectangle: 1290,0 1310,270
  rectangle: 1390,0 1410,270
  rectangle: 1490,0 1510,270
  rectangle: 1590,0 1610,270
  rectangle: 1690,0 1710,270
  rectangle: 1790,0 1810,270
  rectangle: 1890,0 1910,270
  rectangle: 1990,0 2010,270
  rectangle: 2090,0 2110,270
  rectangle: 2190,0 2210,270

## SSW-146-02-S-D [mm]
pads (92):
  oct 1.5x1.5 hole 1: 1(-57.15,-1.27) 2(-57.15,1.27) 3(-54.61,-1.27) 4(-54.61,1.27) 5(-52.07,-1.27) 6(-52.07,1.27) 7(-49.53,-1.27) 8(-49.53,1.27) 9(-46.99,-1.27) 10(-46.99,1.27) 11(-44.45,-1.27) 12(-44.45,1.27) 13(-41.91,-1.27) 14(-41.91,1.27) 15(-39.37,-1.27) 16(-39.37,1.27) 17(-36.83,-1.27) 18(-36.83,1.27) 19(-34.29,-1.27) 20(-34.29,1.27) 21(-31.75,-1.27) 22(-31.75,1.27) 23(-29.21,-1.27) 24(-29.21,1.27) 25(-26.67,-1.27) 26(-26.67,1.27) 27(-24.13,-1.27) 28(-24.13,1.27) 29(-21.59,-1.27) 30(-21.59,1.27) 31(-19.05,-1.27) 32(-19.05,1.27) 33(-16.51,-1.27) 34(-16.51,1.27) 35(-13.97,-1.27) 36(-13.97,1.27) 37(-11.43,-1.27) 38(-11.43,1.27) 39(-8.89,-1.27) 40(-8.89,1.27) 41(-6.35,-1.27) 42(-6.35,1.27) 43(-3.81,-1.27) 44(-3.81,1.27) 45(-1.27,-1.27) 46(-1.27,1.27) 47(1.27,-1.27) 48(1.27,1.27) 49(3.81,-1.27) 50(3.81,1.27) 51(6.35,-1.27) 52(6.35,1.27) 53(8.89,-1.27) 54(8.89,1.27) 55(11.43,-1.27) 56(11.43,1.27) 57(13.97,-1.27) 58(13.97,1.27) 59(16.51,-1.27) 60(16.51,1.27) 61(19.05,-1.27) 62(19.05,1.27) 63(21.59,-1.27) 64(21.59,1.27) 65(24.13,-1.27) 66(24.13,1.27) 67(26.67,-1.27) 68(26.67,1.27) 69(29.21,-1.27) 70(29.21,1.27) 71(31.75,-1.27) 72(31.75,1.27) 73(34.29,-1.27) 74(34.29,1.27) 75(36.83,-1.27) 76(36.83,1.27) 77(39.37,-1.27) 78(39.37,1.27) 79(41.91,-1.27) 80(41.91,1.27) 81(44.45,-1.27) 82(44.45,1.27) 83(46.99,-1.27) 84(46.99,1.27) 85(49.53,-1.27) 86(49.53,1.27) 87(52.07,-1.27) 88(52.07,1.27) 89(54.61,-1.27) 90(54.61,1.27) 91(57.15,-1.27) 92(57.15,1.27)
Top Overlay:
  lines w0.203: -58.549,-2.425 58.549,-2.425 58.549,2.425 -58.549,2.425 -58.549,-2.425
  text "1" at -57.658,-4.318 h1.42
  text "2" at -57.658,2.794 h1.42
Mechanical 16:
  drawing of 368 lines, arcs and shapes, not listed

## SSW-146-02-S-D-RA [mil]
pads (92):
  oct 59.06x59.06 hole 39.37: 1(-2250,60) 2(-2250,160) 3(-2150,60) 4(-2150,160) 5(-2050,60) 6(-2050,160) 7(-1950,60) 8(-1950,160) 9(-1850,60) 10(-1850,160) 11(-1750,60) 12(-1750,160) 13(-1650,60) 14(-1650,160) 15(-1550,60) 16(-1550,160) 17(-1450,60) 18(-1450,160) 19(-1350,60) 20(-1350,160) 21(-1250,60) 22(-1250,160) 23(-1150,60) 24(-1150,160) 25(-1050,60) 26(-1050,160) 27(-950,60) 28(-950,160) 29(-850,60) 30(-850,160) 31(-750,60) 32(-750,160) 33(-650,60) 34(-650,160) 35(-550,60) 36(-550,160) 37(-450,60) 38(-450,160) 39(-350,60) 40(-350,160) 41(-250,60) 42(-250,160) 43(-150,60) 44(-150,160) 45(-50,60) 46(-50,160) 47(50,60) 48(50,160) 49(150,60) 50(150,160) 51(250,60) 52(250,160) 53(350,60) 54(350,160) 55(450,60) 56(450,160) 57(550,60) 58(550,160) 59(650,60) 60(650,160) 61(750,60) 62(750,160) 63(850,60) 64(850,160) 65(950,60) 66(950,160) 67(1050,60) 68(1050,160) 69(1150,60) 70(1150,160) 71(1250,60) 72(1250,160) 73(1350,60) 74(1350,160) 75(1450,60) 76(1450,160) 77(1550,60) 78(1550,160) 79(1650,60) 80(1650,160) 81(1750,60) 82(1750,160) 83(1850,60) 84(1850,160) 85(1950,60) 86(1950,160) 87(2050,60) 88(2050,160) 89(2150,60) 90(2150,160) 91(2250,60) 92(2250,160)
Top Overlay:
  lines w8: -2305.08,-330.55 2305.08,-330.55 2305.08,-4.17 -2305.08,-4.17 -2305.08,-330.55
  text "1" at -2273.43,-301.18 h56.1
  text "2" at -2276.38,-86.61 h56.1
Mechanical 16:
  rectangle: -2260,0 -2240,170
  rectangle: -2160,0 -2140,170
  rectangle: -2060,0 -2040,170
  rectangle: -1960,0 -1940,170
  rectangle: -1860,0 -1840,170
  rectangle: -1760,0 -1740,170
  rectangle: -1660,0 -1640,170
  rectangle: -1560,0 -1540,170
  rectangle: -1460,0 -1440,170
  rectangle: -1360,0 -1340,170
  rectangle: -1260,0 -1240,170
  rectangle: -1160,0 -1140,170
  rectangle: -1060,0 -1040,170
  rectangle: -960,0 -940,170
  rectangle: -860,0 -840,170
  rectangle: -760,0 -740,170
  rectangle: -660,0 -640,170
  rectangle: -560,0 -540,170
  rectangle: -460,0 -440,170
  rectangle: -360,0 -340,170
  rectangle: -260,0 -240,170
  rectangle: -160,0 -140,170
  rectangle: -60,0 -40,170
  rectangle: 40,0 60,170
  rectangle: 140,0 160,170
  rectangle: 240,0 260,170
  rectangle: 340,0 360,170
  rectangle: 440,0 460,170
  rectangle: 540,0 560,170
  rectangle: 640,0 660,170
  rectangle: 740,0 760,170
  rectangle: 840,0 860,170
  rectangle: 940,0 960,170
  rectangle: 1040,0 1060,170
  rectangle: 1140,0 1160,170
  rectangle: 1240,0 1260,170
  rectangle: 1340,0 1360,170
  rectangle: 1440,0 1460,170
  rectangle: 1540,0 1560,170
  rectangle: 1640,0 1660,170
  rectangle: 1740,0 1760,170
  rectangle: 1840,0 1860,170
  rectangle: 1940,0 1960,170
  rectangle: 2040,0 2060,170
  rectangle: 2140,0 2160,170
  rectangle: 2240,0 2260,170

## SSW-146-02-S-Q [mm]
pads (92):
  oct 1.5x1.5 hole 1: 1(-57.15,-2.54) 2(-57.15,2.54) 3(-54.61,-2.54) 4(-54.61,2.54) 5(-52.07,-2.54) 6(-52.07,2.54) 7(-49.53,-2.54) 8(-49.53,2.54) 9(-46.99,-2.54) 10(-46.99,2.54) 11(-44.45,-2.54) 12(-44.45,2.54) 13(-41.91,-2.54) 14(-41.91,2.54) 15(-39.37,-2.54) 16(-39.37,2.54) 17(-36.83,-2.54) 18(-36.83,2.54) 19(-34.29,-2.54) 20(-34.29,2.54) 21(-31.75,-2.54) 22(-31.75,2.54) 23(-29.21,-2.54) 24(-29.21,2.54) 25(-26.67,-2.54) 26(-26.67,2.54) 27(-24.13,-2.54) 28(-24.13,2.54) 29(-21.59,-2.54) 30(-21.59,2.54) 31(-19.05,-2.54) 32(-19.05,2.54) 33(-16.51,-2.54) 34(-16.51,2.54) 35(-13.97,-2.54) 36(-13.97,2.54) 37(-11.43,-2.54) 38(-11.43,2.54) 39(-8.89,-2.54) 40(-8.89,2.54) 41(-6.35,-2.54) 42(-6.35,2.54) 43(-3.81,-2.54) 44(-3.81,2.54) 45(-1.27,-2.54) 46(-1.27,2.54) 47(1.27,-2.54) 48(1.27,2.54) 49(3.81,-2.54) 50(3.81,2.54) 51(6.35,-2.54) 52(6.35,2.54) 53(8.89,-2.54) 54(8.89,2.54) 55(11.43,-2.54) 56(11.43,2.54) 57(13.97,-2.54) 58(13.97,2.54) 59(16.51,-2.54) 60(16.51,2.54) 61(19.05,-2.54) 62(19.05,2.54) 63(21.59,-2.54) 64(21.59,2.54) 65(24.13,-2.54) 66(24.13,2.54) 67(26.67,-2.54) 68(26.67,2.54) 69(29.21,-2.54) 70(29.21,2.54) 71(31.75,-2.54) 72(31.75,2.54) 73(34.29,-2.54) 74(34.29,2.54) 75(36.83,-2.54) 76(36.83,2.54) 77(39.37,-2.54) 78(39.37,2.54) 79(41.91,-2.54) 80(41.91,2.54) 81(44.45,-2.54) 82(44.45,2.54) 83(46.99,-2.54) 84(46.99,2.54) 85(49.53,-2.54) 86(49.53,2.54) 87(52.07,-2.54) 88(52.07,2.54) 89(54.61,-2.54) 90(54.61,2.54) 91(57.15,-2.54) 92(57.15,2.54)
Top Overlay:
  lines w0.203: -58.549,-3.695 58.549,-3.695 58.549,3.695 -58.549,3.695 -58.549,-3.695
  text "1" at -57.658,-5.588 h1.42
  text "2" at -57.658,4.064 h1.42
Mechanical 16:
  drawing of 368 lines, arcs and shapes, not listed